# Altium footprint library Connectors.PcbLib: 245 footprints (part 7 of 16)
Each footprint in its own frame and in the unit in brackets; x right, y up, seen from the top. Pads: shape width x height; smd on the part's side, far side on the other; paste and mask are expansions set on the pad; w line width, h text height; cw(c..) or ccw(c..) is an arc to the next point about the centre after c.
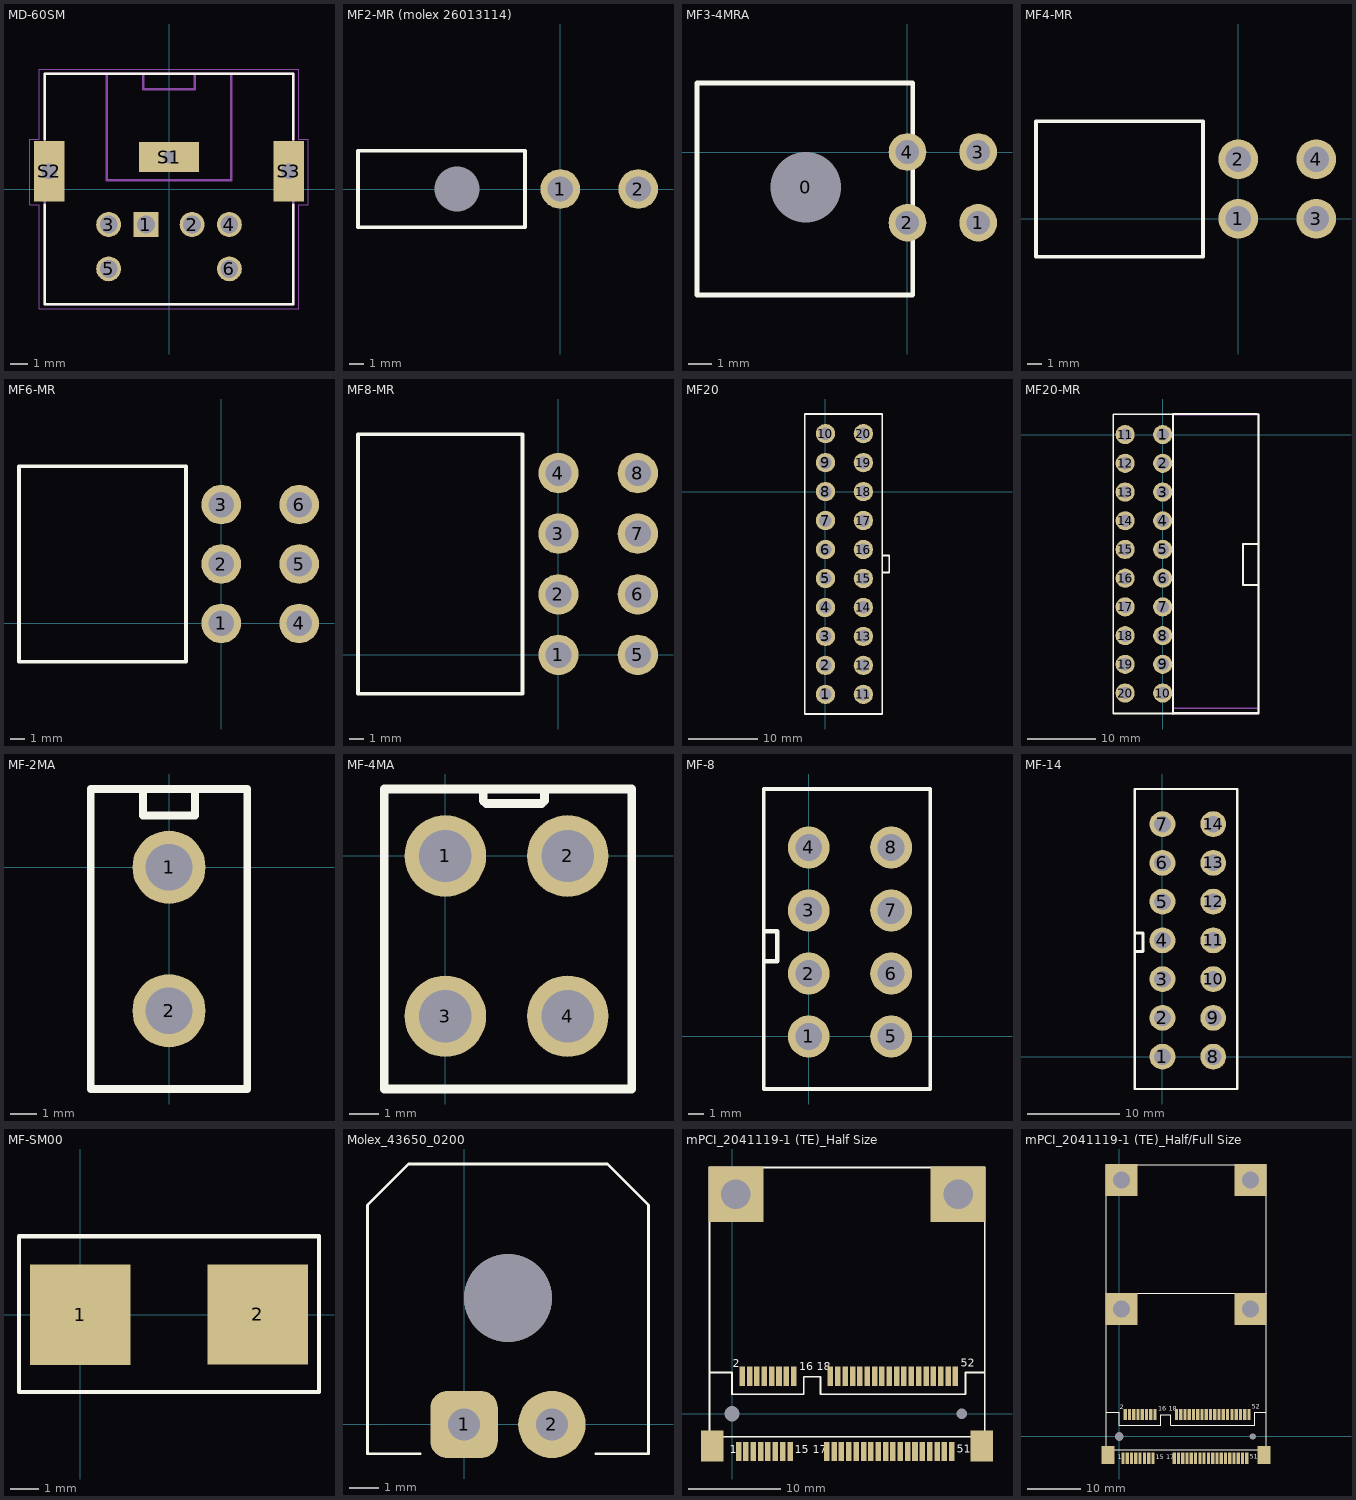
[diagram p6: the footprints below, top view; thin cyan lines are the x and y axes]

## MD-60SM [mm]
pads (9):
  rect 1.4x1.4 hole 1: 1(-1.3,-2)
  round 1.4 hole 1: 2(1.3,-2) 3(-3.4,-2) 4(3.4,-2) 5(-3.4,-4.5) 6(3.4,-4.5)
  rect 3.4x1.7 hole 0.7 square: S1(0,1.8)
  rect 1.7x3.4 hole 0.9 square: S2(-6.75,1) S3(6.75,1)
Top Overlay:
  lines w0.152: -7,-0.9 -7,-6.5 7,-6.5 7,-0.9 ; -7,2.8 -7,6.5 7,6.5 7,2.8
Mechanical 1:
  lines w0: -7.1,-0.1 -6.4,-0.1 -6.4,2.1 -7.1,2.1 -7.1,-0.1 ; -1.1,1.45 1.1,1.45 1.1,2.15 -1.1,2.15 -1.1,1.45 ; 6.4,-0.1 7.1,-0.1 7.1,2.1 6.4,2.1 6.4,-0.1
Mechanical 4:
  lines w0.152: -7,-6.5 7,-6.5 ; -7,-6.5 -7,6.5 ; -7,-6.5 7,-6.5 ; -7,-6.5 -7,6.5 ; -7,6.5 -3.5,6.5 ; -7,6.5 -3.5,6.5 ; -3.5,0.5 -3.5,6.5 ; -3.5,0.5 3.5,0.5 ; -3.5,0.5 -3.5,6.5 ; -3.5,0.5 3.5,0.5 ; -3.5,6.5 3.5,6.5 ; -3.5,6.5 3.5,6.5 ; -1.448,5.612 -1.448,6.42 -1.448,5.612 ; -1.448,5.612 1.448,5.612 ; -1.448,5.612 1.448,5.612 ; 1.448,5.612 1.448,6.42 1.448,5.612 ; 3.5,0.5 3.5,6.5 ; 3.5,0.5 3.5,6.5 ; 3.5,6.5 7,6.5 ; 3.5,6.5 7,6.5 ; 7,-6.5 7,6.5 ; 7,-6.5 7,6.5
Mechanical 16:
  lines w0.05: -7.85,-0.9 -7.3,-0.9 -7.3,-6.75 7.3,-6.75 7.3,-0.9 7.85,-0.9 7.85,2.8 7.3,2.8 7.3,6.75 -7.3,6.75 -7.3,2.8 -7.85,2.8 -7.85,-0.9
3D body "PS2.stp": height 13, standoff -3.8, extent -7,-6.35 7,6.45

## MF2-MR (molex 26013114) [mm]
height 11
pads (3):
  round 2.8 hole 1.8: 1(0,0) 2(5.5,0)
  round 2.8 hole 3.2 unplated: ""(-7.3,0)
Top Overlay:
  lines w0.254: -14.3,-2.7 -2.5,-2.7 -2.5,2.7 -14.3,2.7 -14.3,-2.7
3D body "026013114.stp": height 11.4, standoff -3.6, extent -13.909,-3.083 6.025,2.717

## MF3-4MRA [mm]
pads (5):
  round 2.8 hole 3: 0(-4.32,-1.5)
  round 1.6 hole 1: 1(3,-3) 2(0,-3) 3(3,0) 4(0,0)
Top Overlay:
  lines w0.2: -8.93,-6.07 0.23,-6.07 0.23,2.93 -8.93,2.93 -8.93,-6.07
3D body: height 6.85, standoff 0, extent -8.93,-6.07 0.23,2.93

## MF4-MR [mm]
height 11
pads (4):
  round 2.8 hole 1.8: 1(0,0) 2(0,4.2) 3(5.5,0) 4(5.5,4.2)
Top Overlay:
  lines w0.254: -14.3,-2.7 -14.3,6.9 -2.5,6.9 -2.5,-2.7 -14.3,-2.7
3D body "4761.stp": height 11.4, standoff -3.6, extent -14.017,-3.14 5.917,6.86

## MF6-MR [mm]
height 11
pads (6):
  round 2.8 hole 1.8: 1(0,0) 2(0,4.2) 3(0,8.4) 4(5.5,0) 5(5.5,4.2) 6(5.5,8.4)
Top Overlay:
  lines w0.254: -14.3,-2.7 -14.3,11.1 -2.5,11.1 -2.5,-2.7 -14.3,-2.7
3D body "4764.stp": height 11.4, standoff -3.6, extent -13.977,-3.05 5.957,11.15

## MF8-MR [mm]
height 11
pads (8):
  round 2.8 hole 1.8: 1(0,0) 2(0,4.2) 3(0,8.4) 4(0,12.6) 5(5.5,0) 6(5.5,4.2) 7(5.5,8.4) 8(5.5,12.6)
Top Overlay:
  lines w0.254: -13.9,-2.7 -2.5,-2.7 -2.5,15.3 -13.9,15.3 -13.9,-2.7
3D body "MF-8MR.STEP": height 11.4, standoff -3.5, extent -13.9,-2.7 4.77,15.3

## MF20 [mm]
pads (20):
  round 2.8 hole 1.8: 1(0,-29.4) 2(0,-25.2) 3(0,-21) 4(0,-16.8) 5(0,-12.6) 6(0,-8.4) 7(0,-4.2) 8(0,0) 9(0,4.2) 10(0,8.4) 11(5.5,-29.4) 12(5.5,-25.2) 13(5.5,-21) 14(5.5,-16.8) 15(5.5,-12.6) 16(5.5,-8.4) 17(5.5,-4.2) 18(5.5,0) 19(5.5,4.2) 20(5.5,8.4)
Top Overlay:
  lines w0.254: 8.25,-11.75 9.25,-11.75 9.25,-9.25 8.25,-9.25 ; -3,-32.25 -3,11.25 8.25,11.25 8.25,-32.25 -3,-32.25

## MF20-MR [mm]
pads (20):
  round 2.8 hole 1.8: 1(0,0) 2(0,-4.2) 3(0,-8.4) 4(0,-12.6) 5(0,-16.8) 6(0,-21) 7(0,-25.2) 8(0,-29.4) 9(0,-33.6) 10(0,-37.8) 11(-5.5,0) 12(-5.5,-4.2) 13(-5.5,-8.4) 14(-5.5,-12.6) 15(-5.5,-16.8) 16(-5.5,-21) 17(-5.5,-25.2) 18(-5.5,-29.4) 19(-5.5,-33.6) 20(-5.5,-37.8)
Top Overlay:
  lines w0.254: 1.5,-40.86 1.5,3.01 ; 1.5,3 13.75,3 ; 1.56,-40.68 14.06,-40.68 ; 14,-22 11.75,-22 11.75,-16 14,-16 ; -7.25,-40.8 -7.25,2.99 14,2.99 14,-40.8 -7.25,-40.8
Mechanical 1:
  lines w0.254: 1.5,-40 14,-40 ; 1.5,3 14,3 ; 1.5,-40.8 1.5,2.95 14,2.95 14,-40.8 1.5,-40.8
Mechanical 13:
  lines w0.254: 13.75,-22 11.75,-22 11.75,-16 14,-16
3D body "4782.stp": height 11.4, standoff -3.6, extent -6.057,-40.48 13.877,3.12

## MF-2МА [mm]
pads (2):
  round 2.8 hole 1.8: 1(0,0) 2(0,-5.5)
Top Overlay:
  lines w0.3: -1,2.98 -1,1.98 1,1.98 1,2.98 ; -3,-8.5 3,-8.5 3,3 -3,3 -3,-8.5
3D body "4635.stp": height 12.8, standoff -3.5, extent -3.03,-7.75 3.17,3.25

## MF-4MA [mm]
pads (4):
  round 2.8 hole 1.8: 1(0,0) 2(4.2,0) 3(0,-5.5) 4(4.2,-5.5)
Top Overlay:
  lines w0.3: 1.3,2.3 1.3,1.9 1.4,1.8 3.3,1.8 3.4,1.9 3.4,2.3 ; -2.1,-8 -2.1,2.3 6.4,2.3 6.4,-8 -2.1,-8

## MF-8 [mm]
height 11
pads (8):
  round 2.8 hole 1.8: 1(0,0) 2(0,4.2) 3(0,8.4) 4(0,12.6) 5(5.5,0) 6(5.5,4.2) 7(5.5,8.4) 8(5.5,12.6)
Top Overlay:
  lines w0.254: -3,-3.5 8.1,-3.5 8.1,16.5 -3,16.5 -3,-3.5
  lines w0.3: -2.9,5 -2.1,5 -2.1,7 -2.9,7

## MF-14 [mm]
pads (14):
  round 2.8 hole 1.8: 1(0,0) 2(0,4.2) 3(0,8.4) 4(0,12.6) 5(0,16.8) 6(0,21) 7(0,25.2) 8(5.5,0) 9(5.5,4.2) 10(5.5,8.4) 11(5.5,12.6) 12(5.5,16.8) 13(5.5,21) 14(5.5,25.2)
Top Overlay:
  lines w0.254: -3,-3.5 -3,29 8.1,29 8.1,-3.5 -3,-3.5
  lines w0.3: -2.9,11.4 -2.1,11.4 -2.1,13.4 -2.9,13.4

## MF-SM00 [mm] "Fuse.   Footprint FOR MF-SM030, 050, 075, 075/60, 100/33, 125, 260, 300"
pads (2):
  rect 3.5x3.5 smd: 1(0,0) 2(6.19,0.01)
Top Overlay:
  lines w0.15: 8.32,-2.7 -2.14,-2.7 -2.14,2.74 8.32,2.74 8.33,2.75 8.33,-2.69
3D body "User Library-MF-SM100.step": height 4, standoff 0, extent -0.594,-2.448 6.906,2.552

## Molex_43650_0200 [mm] "Ответка 43645-0200 +  43030-0001"
pads (3):
  rrect50% 2.3x2.3 hole 1.1: 1(0,0)
  round 2.3 hole 1.1: 2(3,0)
  round 3 hole 3: ""(1.5,4.32)
Top Overlay:
  lines w0.1: -1.5,-1 -3.3,-1 -3.3,7.5 -1.9,8.9 4.9,8.9 6.3,7.5 6.3,-1 4.5,-1
3D body "123.stp": height 5.64, standoff -3.27, extent -3.325,-0.95 6.325,8.95

## mPCI_2041119-1 (TE)_Half Size [mm]
pads (58):
  rect 0.6x2.1 smd: 1(0.7,-4.1) 2(1.1,4.1) 3(1.5,-4.1) 4(1.9,4.1) 5(2.3,-4.1) 6(2.7,4.1) 7(3.1,-4.1) 8(3.5,4.1) 9(3.9,-4.1) 10(4.3,4.1) 11(4.7,-4.1) 12(5.1,4.1) 13(5.5,-4.1) 14(5.9,4.1) 15(6.3,-4.1) 16(6.7,4.1) 17(10.3,-4.1) 18(10.7,4.1) 19(11.1,-4.1) 20(11.5,4.1) 21(11.9,-4.1) 22(12.3,4.1) 23(12.7,-4.1) 24(13.1,4.1) 25(13.5,-4.1) 26(13.9,4.1) 27(14.3,-4.1) 28(14.7,4.1) 29(15.1,-4.1) 30(15.5,4.1) 31(15.9,-4.1) 32(16.3,4.1) 33(16.7,-4.1) 34(17.1,4.1) 35(17.5,-4.1) 36(17.9,4.1) 37(18.3,-4.1) 38(18.7,4.1) 39(19.1,-4.1) 40(19.5,4.1) 41(19.9,-4.1) 42(20.3,4.1) 43(20.7,-4.1) 44(21.1,4.1) 45(21.5,-4.1) 46(21.9,4.1) 47(22.3,-4.1) 48(22.7,4.1) 49(23.1,-4.1) 50(23.5,4.1) 51(23.9,-4.1) 52(24.3,4.1)
  rect 2.45x3.35 smd: ""(-2.15,-3.5) ""(27.15,-3.5)
  round 0 hole 1.65 unplated: ""(0,0)
  rect 6x6 hole 3.2 unplated: ""(0.4,23.9) ""(24.6,23.9)
  round 0 hole 1.15 unplated: ""(25,0)
Top Overlay:
  lines w0.2: -2.48,4.49 -2.48,26.8 27.47,26.8 27.5,26.77 27.5,4.48 ; -2.48,4.49 0,4.49 0,2.12 7.8,2.12 7.8,4.04 9.6,4.04 9.6,2.12 25.4,2.12 25.4,4.48 27.5,4.48 ; -2.48,4.49 -2.48,-2.5 27.5,-2.5 27.5,4.48
  text "1" at -0.27,-4.63 h1.5
  text "15" at 6.84,-4.63 h1.5
  text "17" at 8.76,-4.63 h1.5
  text "51" at 24.46,-4.56 h1.5
  text "52" at 24.86,4.8 h1.5
  text "18" at 9.23,4.4 h1.5
  text "16" at 7.28,4.42 h1.5
  text "2" at 0.05,4.73 h1.5
3D body "PCIe-MINI-H2.stp": height 4.91, standoff 0.19, extent -2.456,-0.205 27.544,26.595
3D body "c-2041119-1-c-3d.stp": height 4, standoff -0.65, extent -2.46,-4.585 27.44,4.505

## mPCI_2041119-1 (TE)_Half/Full Size [mm]
pads (60):
  rect 0.6x2.1 smd: 1(0.7,-4.1) 2(1.1,4.1) 3(1.5,-4.1) 4(1.9,4.1) 5(2.3,-4.1) 6(2.7,4.1) 7(3.1,-4.1) 8(3.5,4.1) 9(3.9,-4.1) 10(4.3,4.1) 11(4.7,-4.1) 12(5.1,4.1) 13(5.5,-4.1) 14(5.9,4.1) 15(6.3,-4.1) 16(6.7,4.1) 17(10.3,-4.1) 18(10.7,4.1) 19(11.1,-4.1) 20(11.5,4.1) 21(11.9,-4.1) 22(12.3,4.1) 23(12.7,-4.1) 24(13.1,4.1) 25(13.5,-4.1) 26(13.9,4.1) 27(14.3,-4.1) 28(14.7,4.1) 29(15.1,-4.1) 30(15.5,4.1) 31(15.9,-4.1) 32(16.3,4.1) 33(16.7,-4.1) 34(17.1,4.1) 35(17.5,-4.1) 36(17.9,4.1) 37(18.3,-4.1) 38(18.7,4.1) 39(19.1,-4.1) 40(19.5,4.1) 41(19.9,-4.1) 42(20.3,4.1) 43(20.7,-4.1) 44(21.1,4.1) 45(21.5,-4.1) 46(21.9,4.1) 47(22.3,-4.1) 48(22.7,4.1) 49(23.1,-4.1) 50(23.5,4.1) 51(23.9,-4.1) 52(24.3,4.1)
  rect 2.45x3.35 smd: ""(-2.15,-3.5) ""(27.15,-3.5)
  round 0 hole 1.65 unplated: ""(0,0)
  rect 6x6 hole 3.2 unplated: ""(0.4,23.9) ""(0.4,48.05) ""(24.6,23.9) ""(24.6,48.05)
  round 0 hole 1.15 unplated: ""(25,0)
Top Overlay:
  lines w0.2: -2.48,26.8 27.47,26.8 27.5,26.77 ; -2.48,50.93 -2.48,4.49 ; -2.48,50.95 27.5,50.95 ; 27.5,50.92 27.5,4.48 ; -2.48,4.49 0,4.49 0,2.12 7.8,2.12 7.8,4.04 9.6,4.04 9.6,2.12 25.4,2.12 25.4,4.48 27.5,4.48 ; -2.48,4.49 -2.48,-2.5 27.5,-2.5 27.5,4.48
  text "1" at -0.27,-4.63 h1.5
  text "15" at 6.84,-4.63 h1.5
  text "17" at 8.76,-4.63 h1.5
  text "51" at 24.46,-4.56 h1.5
  text "52" at 24.86,4.8 h1.5
  text "18" at 9.23,4.4 h1.5
  text "16" at 7.28,4.42 h1.5
  text "2" at 0.05,4.73 h1.5
3D body "c-2041119-1-c-3d.stp": height 4, standoff -0.65, extent -2.46,-4.585 27.44,4.505
3D body "User Library-mSata SSD.step": height 4.35, standoff 0.65, extent -2.425,0.06 27.425,50.86